# Altium integrated library Samtec 2 mm Pitch Terminal Strips.IntLib: 623 symbols (part 4 of 5)
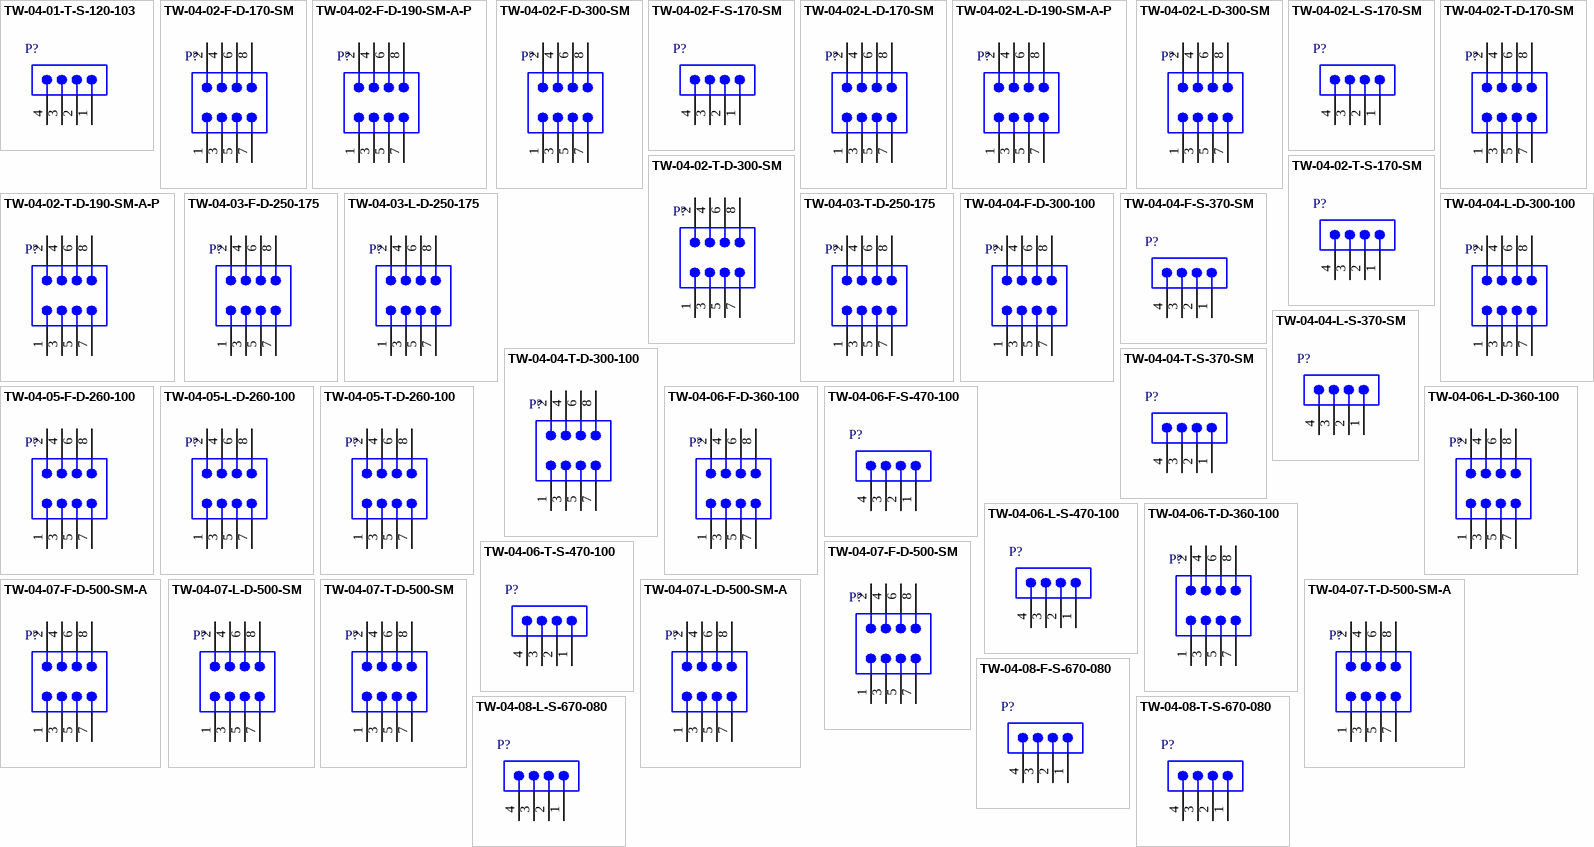
[diagram p20: symbols TW-04-01-T-S-120-103 to TW-04-08-T-S-670-080]

## TW-04-06-T-D-360-100
designator P?
Through-Hole Board Stacker, Vertical, -55 to 105 degC, 2 mm Pitch, 8-Pin, Male, RoHS; Manufacturer: Samtec; PartNumber: TW-04-06-T-D-360-100; Pitch: 2 mm; DatasheetVersion: F-214; PackageVersion: BF, 6/1998; PackageReference: TW-04-06-X-D-360-100; PackageDescription: High Temp 2mm Terminal Strip(Board Stacking); Orientation: Vertical; RoHS: True; Temperature Range: -55 to 105 degC; Mounting Technology: Through-hole; ComponentLink1Description: Manufacturer URL; ComponentLink1URL: http://www.samtec.com; ComponentLink2Description: Datasheet; ComponentLink2URL: http://d2a072wq521u33.cloudfront.net/catalog_english//TW_TH.PDF; ComponentLink3Description: Package Specification; ComponentLink3URL: http://www.samtec.com/documents/webfiles/cpdf/TW-XX-XX-X-X-XXX-XXX-XXX-XX-MKT2.pdf
footprint SMTC-TW-04-06-X-D-360-100 (Terminal Strip, 2x4 Pins, Vertical, 2mm Pitch, Male)
pins: 1, 2, 3, 4, 5, 6, 7, 8

## TW-04-06-T-S-470-100
designator P?
Through-Hole Board Stacker, Vertical, -55 to 105 degC, 2 mm Pitch, 4-Pin, Male, RoHS; Manufacturer: Samtec; PartNumber: TW-04-06-T-S-470-100; Pitch: 2 mm; DatasheetVersion: F-214; PackageVersion: BF, 6/1998; PackageReference: TW-04-06-X-S-470-100; PackageDescription: High Temp 2mm Terminal Strip(Board Stacking); Orientation: Vertical; RoHS: True; Temperature Range: -55 to 105 degC; Mounting Technology: Through-hole; ComponentLink1Description: Manufacturer URL; ComponentLink1URL: http://www.samtec.com; ComponentLink2Description: Datasheet; ComponentLink2URL: http://d2a072wq521u33.cloudfront.net/catalog_english//TW_TH.PDF; ComponentLink3Description: Package Specification; ComponentLink3URL: http://www.samtec.com/documents/webfiles/cpdf/TW-XX-XX-X-X-XXX-XXX-XXX-XX-MKT2.pdf
footprint SMTC-TW-04-06-X-S-470-100 (Terminal Strip, 1x4 Pins, Vertical, 2mm Pitch, Male)
pins: 1, 2, 3, 4

## TW-04-07-F-D-500-SM
designator P?
SMT Board Stacker, Vertical, -55 to 125 degC, 2 mm Pitch, 8-Pin, Male, RoHS; Manufacturer: Samtec; PartNumber: TW-04-07-F-D-500-SM; Pitch: 2 mm; DatasheetVersion: F-214; PackageVersion: CL, 3/1993; PackageReference: TW-04-07-X-D-500-SM; PackageDescription: High Temp 2mm SMT Board Stacking Terminal Strip ASM; Orientation: Vertical; RoHS: True; Temperature Range: -55 to 125 degC; Mounting Technology: Surface Mount; ComponentLink1Description: Manufacturer URL; ComponentLink1URL: http://www.samtec.com; ComponentLink2Description: Datasheet; ComponentLink2URL: http://d2a072wq521u33.cloudfront.net/catalog_english//TW_SM.PDF; ComponentLink3Description: Package Specification; ComponentLink3URL: http://www.samtec.com/documents/webfiles/cpdf/TW-XX-XX-XXX-X-XXX-SM-XXX-XX-MKT1.pdf
footprint SMTC-TW-04-07-X-D-500-SM (SMT Board Stacking Terminal Strip ASM, 2x4 Pins, Vertical, 2mm Pitch, Male)
pins: 1, 2, 3, 4, 5, 6, 7, 8

## TW-04-07-F-D-500-SM-A
designator P?
SMT Board Stacker, Vertical, -55 to 125 degC, 2 mm Pitch, 8-Pin, Male, RoHS; Manufacturer: Samtec; PartNumber: TW-04-07-F-D-500-SM-A; Pitch: 2 mm; DatasheetVersion: F-214; PackageVersion: CL, 3/1993; PackageReference: TW-04-07-X-D-500-SM-A; PackageDescription: High Temp 2mm SMT Board Stacking Terminal Strip ASM; Orientation: Vertical; RoHS: True; Temperature Range: -55 to 125 degC; Mounting Technology: Surface Mount; ComponentLink1Description: Manufacturer URL; ComponentLink1URL: http://www.samtec.com; ComponentLink2Description: Datasheet; ComponentLink2URL: http://d2a072wq521u33.cloudfront.net/catalog_english//TW_SM.PDF; ComponentLink3Description: Package Specification; ComponentLink3URL: http://www.samtec.com/documents/webfiles/cpdf/TW-XX-XX-XXX-X-XXX-SM-XXX-XX-MKT1.pdf
footprint SMTC-TW-04-07-X-D-500-SM-A (SMT Board Stacking Terminal Strip ASM, 2x4 Pins, Vertical, 2mm Pitch, Male)
pins: 1, 2, 3, 4, 5, 6, 7, 8

## TW-04-07-L-D-500-SM
designator P?
SMT Board Stacker, Vertical, -55 to 125 degC, 2 mm Pitch, 8-Pin, Male, RoHS; Manufacturer: Samtec; PartNumber: TW-04-07-L-D-500-SM; Pitch: 2 mm; DatasheetVersion: F-214; PackageVersion: CL, 3/1993; PackageReference: TW-04-07-X-D-500-SM; PackageDescription: High Temp 2mm SMT Board Stacking Terminal Strip ASM; Orientation: Vertical; RoHS: True; Temperature Range: -55 to 125 degC; Mounting Technology: Surface Mount; ComponentLink1Description: Manufacturer URL; ComponentLink1URL: http://www.samtec.com; ComponentLink2Description: Datasheet; ComponentLink2URL: http://d2a072wq521u33.cloudfront.net/catalog_english//TW_SM.PDF; ComponentLink3Description: Package Specification; ComponentLink3URL: http://www.samtec.com/documents/webfiles/cpdf/TW-XX-XX-XXX-X-XXX-SM-XXX-XX-MKT1.pdf
footprint SMTC-TW-04-07-X-D-500-SM (SMT Board Stacking Terminal Strip ASM, 2x4 Pins, Vertical, 2mm Pitch, Male)
pins: 1, 2, 3, 4, 5, 6, 7, 8

## TW-04-07-L-D-500-SM-A
designator P?
SMT Board Stacker, Vertical, -55 to 125 degC, 2 mm Pitch, 8-Pin, Male, RoHS; Manufacturer: Samtec; PartNumber: TW-04-07-L-D-500-SM-A; Pitch: 2 mm; DatasheetVersion: F-214; PackageVersion: CL, 3/1993; PackageReference: TW-04-07-X-D-500-SM-A; PackageDescription: High Temp 2mm SMT Board Stacking Terminal Strip ASM; Orientation: Vertical; RoHS: True; Temperature Range: -55 to 125 degC; Mounting Technology: Surface Mount; ComponentLink1Description: Manufacturer URL; ComponentLink1URL: http://www.samtec.com; ComponentLink2Description: Datasheet; ComponentLink2URL: http://d2a072wq521u33.cloudfront.net/catalog_english//TW_SM.PDF; ComponentLink3Description: Package Specification; ComponentLink3URL: http://www.samtec.com/documents/webfiles/cpdf/TW-XX-XX-XXX-X-XXX-SM-XXX-XX-MKT1.pdf
footprint SMTC-TW-04-07-X-D-500-SM-A (SMT Board Stacking Terminal Strip ASM, 2x4 Pins, Vertical, 2mm Pitch, Male)
pins: 1, 2, 3, 4, 5, 6, 7, 8

## TW-04-07-T-D-500-SM
designator P?
SMT Board Stacker, Vertical, -55 to 105 degC, 2 mm Pitch, 8-Pin, Male, RoHS; Manufacturer: Samtec; PartNumber: TW-04-07-T-D-500-SM; Pitch: 2 mm; DatasheetVersion: F-214; PackageVersion: CL, 3/1993; PackageReference: TW-04-07-X-D-500-SM; PackageDescription: High Temp 2mm SMT Board Stacking Terminal Strip ASM; Orientation: Vertical; RoHS: True; Temperature Range: -55 to 105 degC; Mounting Technology: Surface Mount; ComponentLink1Description: Manufacturer URL; ComponentLink1URL: http://www.samtec.com; ComponentLink2Description: Datasheet; ComponentLink2URL: http://d2a072wq521u33.cloudfront.net/catalog_english//TW_SM.PDF; ComponentLink3Description: Package Specification; ComponentLink3URL: http://www.samtec.com/documents/webfiles/cpdf/TW-XX-XX-XXX-X-XXX-SM-XXX-XX-MKT1.pdf
footprint SMTC-TW-04-07-X-D-500-SM (SMT Board Stacking Terminal Strip ASM, 2x4 Pins, Vertical, 2mm Pitch, Male)
pins: 1, 2, 3, 4, 5, 6, 7, 8

## TW-04-07-T-D-500-SM-A
designator P?
SMT Board Stacker, Vertical, -55 to 105 degC, 2 mm Pitch, 8-Pin, Male, RoHS; Manufacturer: Samtec; PartNumber: TW-04-07-T-D-500-SM-A; Pitch: 2 mm; DatasheetVersion: F-214; PackageVersion: CL, 3/1993; PackageReference: TW-04-07-X-D-500-SM-A; PackageDescription: High Temp 2mm SMT Board Stacking Terminal Strip ASM; Orientation: Vertical; RoHS: True; Temperature Range: -55 to 105 degC; Mounting Technology: Surface Mount; ComponentLink1Description: Manufacturer URL; ComponentLink1URL: http://www.samtec.com; ComponentLink2Description: Datasheet; ComponentLink2URL: http://d2a072wq521u33.cloudfront.net/catalog_english//TW_SM.PDF; ComponentLink3Description: Package Specification; ComponentLink3URL: http://www.samtec.com/documents/webfiles/cpdf/TW-XX-XX-XXX-X-XXX-SM-XXX-XX-MKT1.pdf
footprint SMTC-TW-04-07-X-D-500-SM-A (SMT Board Stacking Terminal Strip ASM, 2x4 Pins, Vertical, 2mm Pitch, Male)
pins: 1, 2, 3, 4, 5, 6, 7, 8

## TW-04-08-F-S-670-080
designator P?
Through-Hole Board Stacker, Vertical, -55 to 125 degC, 2 mm Pitch, 4-Pin, Male, RoHS; Manufacturer: Samtec; PartNumber: TW-04-08-F-S-670-080; Pitch: 2 mm; DatasheetVersion: F-214; PackageVersion: BF, 6/1998; PackageReference: TW-04-08-X-S-670-080; PackageDescription: High Temp 2mm Terminal Strip(Board Stacking); Orientation: Vertical; RoHS: True; Temperature Range: -55 to 125 degC; Mounting Technology: Through-hole; ComponentLink1Description: Manufacturer URL; ComponentLink1URL: http://www.samtec.com; ComponentLink2Description: Datasheet; ComponentLink2URL: http://d2a072wq521u33.cloudfront.net/catalog_english//TW_TH.PDF; ComponentLink3Description: Package Specification; ComponentLink3URL: http://www.samtec.com/documents/webfiles/cpdf/TW-XX-XX-X-X-XXX-XXX-XXX-XX-MKT2.pdf
footprint SMTC-TW-04-08-X-S-670-080 (Terminal Strip, 1x4 Pins, Vertical, 2mm Pitch, Male)
pins: 1, 2, 3, 4

## TW-04-08-L-S-670-080
designator P?
Through-Hole Board Stacker, Vertical, -55 to 125 degC, 2 mm Pitch, 4-Pin, Male, RoHS; Manufacturer: Samtec; PartNumber: TW-04-08-L-S-670-080; Pitch: 2 mm; DatasheetVersion: F-214; PackageVersion: BF, 6/1998; PackageReference: TW-04-08-X-S-670-080; PackageDescription: High Temp 2mm Terminal Strip(Board Stacking); Orientation: Vertical; RoHS: True; Temperature Range: -55 to 125 degC; Mounting Technology: Through-hole; ComponentLink1Description: Manufacturer URL; ComponentLink1URL: http://www.samtec.com; ComponentLink2Description: Datasheet; ComponentLink2URL: http://d2a072wq521u33.cloudfront.net/catalog_english//TW_TH.PDF; ComponentLink3Description: Package Specification; ComponentLink3URL: http://www.samtec.com/documents/webfiles/cpdf/TW-XX-XX-X-X-XXX-XXX-XXX-XX-MKT2.pdf
footprint SMTC-TW-04-08-X-S-670-080 (Terminal Strip, 1x4 Pins, Vertical, 2mm Pitch, Male)
pins: 1, 2, 3, 4

## TW-04-08-T-S-670-080
designator P?
Through-Hole Board Stacker, Vertical, -55 to 105 degC, 2 mm Pitch, 4-Pin, Male, RoHS; Manufacturer: Samtec; PartNumber: TW-04-08-T-S-670-080; Pitch: 2 mm; DatasheetVersion: F-214; PackageVersion: BF, 6/1998; PackageReference: TW-04-08-X-S-670-080; PackageDescription: High Temp 2mm Terminal Strip(Board Stacking); Orientation: Vertical; RoHS: True; Temperature Range: -55 to 105 degC; Mounting Technology: Through-hole; ComponentLink1Description: Manufacturer URL; ComponentLink1URL: http://www.samtec.com; ComponentLink2Description: Datasheet; ComponentLink2URL: http://d2a072wq521u33.cloudfront.net/catalog_english//TW_TH.PDF; ComponentLink3Description: Package Specification; ComponentLink3URL: http://www.samtec.com/documents/webfiles/cpdf/TW-XX-XX-X-X-XXX-XXX-XXX-XX-MKT2.pdf
footprint SMTC-TW-04-08-X-S-670-080 (Terminal Strip, 1x4 Pins, Vertical, 2mm Pitch, Male)
pins: 1, 2, 3, 4

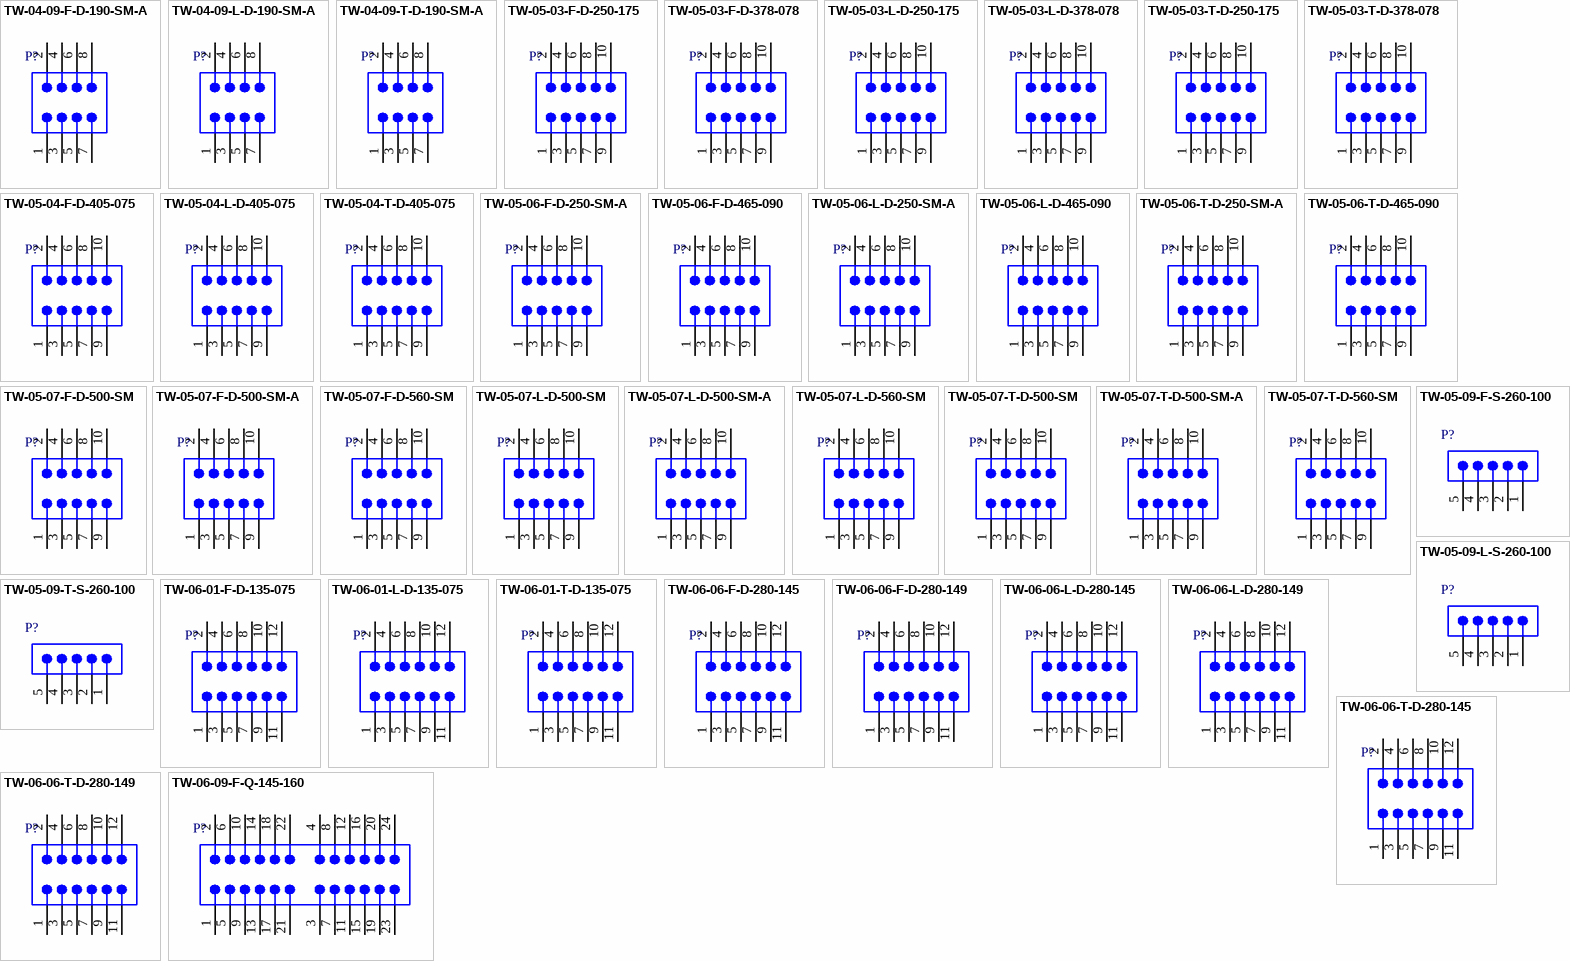
[diagram p11: symbols TW-04-09-F-D-190-SM-A to TW-06-09-F-Q-145-160]

## TW-04-09-F-D-190-SM-A
designator P?
SMT Board Stacker, Vertical, -55 to 125 degC, 2 mm Pitch, 8-Pin, Male, RoHS; Manufacturer: Samtec; PartNumber: TW-04-09-F-D-190-SM-A; Pitch: 2 mm; DatasheetVersion: F-214; PackageVersion: CL, 3/1993; PackageReference: TW-04-09-X-D-190-SM-A; PackageDescription: High Temp 2mm SMT Board Stacking Terminal Strip ASM; Orientation: Vertical; RoHS: True; Temperature Range: -55 to 125 degC; Mounting Technology: Surface Mount; ComponentLink1Description: Manufacturer URL; ComponentLink1URL: http://www.samtec.com; ComponentLink2Description: Datasheet; ComponentLink2URL: http://d2a072wq521u33.cloudfront.net/catalog_english//TW_SM.PDF; ComponentLink3Description: Package Specification; ComponentLink3URL: http://www.samtec.com/documents/webfiles/cpdf/TW-XX-XX-XXX-X-XXX-SM-XXX-XX-MKT1.pdf
footprint SMTC-TW-04-09-X-D-190-SM-A (SMT Board Stacking Terminal Strip ASM, 2x4 Pins, Vertical, 2mm Pitch, Male)
pins: 1, 2, 3, 4, 5, 6, 7, 8

## TW-04-09-L-D-190-SM-A
designator P?
SMT Board Stacker, Vertical, -55 to 125 degC, 2 mm Pitch, 8-Pin, Male, RoHS; Manufacturer: Samtec; PartNumber: TW-04-09-L-D-190-SM-A; Pitch: 2 mm; DatasheetVersion: F-214; PackageVersion: CL, 3/1993; PackageReference: TW-04-09-X-D-190-SM-A; PackageDescription: High Temp 2mm SMT Board Stacking Terminal Strip ASM; Orientation: Vertical; RoHS: True; Temperature Range: -55 to 125 degC; Mounting Technology: Surface Mount; ComponentLink1Description: Manufacturer URL; ComponentLink1URL: http://www.samtec.com; ComponentLink2Description: Datasheet; ComponentLink2URL: http://d2a072wq521u33.cloudfront.net/catalog_english//TW_SM.PDF; ComponentLink3Description: Package Specification; ComponentLink3URL: http://www.samtec.com/documents/webfiles/cpdf/TW-XX-XX-XXX-X-XXX-SM-XXX-XX-MKT1.pdf
footprint SMTC-TW-04-09-X-D-190-SM-A (SMT Board Stacking Terminal Strip ASM, 2x4 Pins, Vertical, 2mm Pitch, Male)
pins: 1, 2, 3, 4, 5, 6, 7, 8

## TW-04-09-T-D-190-SM-A
designator P?
SMT Board Stacker, Vertical, -55 to 105 degC, 2 mm Pitch, 8-Pin, Male, RoHS; Manufacturer: Samtec; PartNumber: TW-04-09-T-D-190-SM-A; Pitch: 2 mm; DatasheetVersion: F-214; PackageVersion: CL, 3/1993; PackageReference: TW-04-09-X-D-190-SM-A; PackageDescription: High Temp 2mm SMT Board Stacking Terminal Strip ASM; Orientation: Vertical; RoHS: True; Temperature Range: -55 to 105 degC; Mounting Technology: Surface Mount; ComponentLink1Description: Manufacturer URL; ComponentLink1URL: http://www.samtec.com; ComponentLink2Description: Datasheet; ComponentLink2URL: http://d2a072wq521u33.cloudfront.net/catalog_english//TW_SM.PDF; ComponentLink3Description: Package Specification; ComponentLink3URL: http://www.samtec.com/documents/webfiles/cpdf/TW-XX-XX-XXX-X-XXX-SM-XXX-XX-MKT1.pdf
footprint SMTC-TW-04-09-X-D-190-SM-A (SMT Board Stacking Terminal Strip ASM, 2x4 Pins, Vertical, 2mm Pitch, Male)
pins: 1, 2, 3, 4, 5, 6, 7, 8

## TW-05-03-F-D-250-175
designator P?
Through-Hole Board Stacker, Vertical, -55 to 125 degC, 2 mm Pitch, 10-Pin, Male, RoHS; Manufacturer: Samtec; PartNumber: TW-05-03-F-D-250-175; Pitch: 2 mm; DatasheetVersion: F-214; PackageVersion: BF, 6/1998; PackageReference: TW-05-03-X-D-250-175; PackageDescription: High Temp 2mm Terminal Strip(Board Stacking); Orientation: Vertical; RoHS: True; Temperature Range: -55 to 125 degC; Mounting Technology: Through-hole; ComponentLink1Description: Manufacturer URL; ComponentLink1URL: http://www.samtec.com; ComponentLink2Description: Datasheet; ComponentLink2URL: http://d2a072wq521u33.cloudfront.net/catalog_english//TW_TH.PDF; ComponentLink3Description: Package Specification; ComponentLink3URL: http://www.samtec.com/documents/webfiles/cpdf/TW-XX-XX-X-X-XXX-XXX-XXX-XX-MKT2.pdf
footprint SMTC-TW-05-03-X-D-250-175 (Terminal Strip, 2x5 Pins, Vertical, 2mm Pitch, Male)
pins: 1, 2, 3, 4, 5, 6, 7, 8, 9, 10

## TW-05-03-F-D-378-078
designator P?
Through-Hole Board Stacker, Vertical, -55 to 125 degC, 2 mm Pitch, 10-Pin, Male, RoHS; Manufacturer: Samtec; PartNumber: TW-05-03-F-D-378-078; Pitch: 2 mm; DatasheetVersion: F-214; PackageVersion: BF, 6/1998; PackageReference: TW-05-03-X-D-378-078; PackageDescription: High Temp 2mm Terminal Strip(Board Stacking); Orientation: Vertical; RoHS: True; Temperature Range: -55 to 125 degC; Mounting Technology: Through-hole; ComponentLink1Description: Manufacturer URL; ComponentLink1URL: http://www.samtec.com; ComponentLink2Description: Datasheet; ComponentLink2URL: http://d2a072wq521u33.cloudfront.net/catalog_english//TW_TH.PDF; ComponentLink3Description: Package Specification; ComponentLink3URL: http://www.samtec.com/documents/webfiles/cpdf/TW-XX-XX-X-X-XXX-XXX-XXX-XX-MKT2.pdf
footprint SMTC-TW-05-03-X-D-378-078 (Terminal Strip, 2x5 Pins, Vertical, 2mm Pitch, Male)
pins: 1, 2, 3, 4, 5, 6, 7, 8, 9, 10

## TW-05-03-L-D-250-175
designator P?
Through-Hole Board Stacker, Vertical, -55 to 125 degC, 2 mm Pitch, 10-Pin, Male, RoHS; Manufacturer: Samtec; PartNumber: TW-05-03-L-D-250-175; Pitch: 2 mm; DatasheetVersion: F-214; PackageVersion: BF, 6/1998; PackageReference: TW-05-03-X-D-250-175; PackageDescription: High Temp 2mm Terminal Strip(Board Stacking); Orientation: Vertical; RoHS: True; Temperature Range: -55 to 125 degC; Mounting Technology: Through-hole; ComponentLink1Description: Manufacturer URL; ComponentLink1URL: http://www.samtec.com; ComponentLink2Description: Datasheet; ComponentLink2URL: http://d2a072wq521u33.cloudfront.net/catalog_english//TW_TH.PDF; ComponentLink3Description: Package Specification; ComponentLink3URL: http://www.samtec.com/documents/webfiles/cpdf/TW-XX-XX-X-X-XXX-XXX-XXX-XX-MKT2.pdf
footprint SMTC-TW-05-03-X-D-250-175 (Terminal Strip, 2x5 Pins, Vertical, 2mm Pitch, Male)
pins: 1, 2, 3, 4, 5, 6, 7, 8, 9, 10

## TW-05-03-L-D-378-078
designator P?
Through-Hole Board Stacker, Vertical, -55 to 125 degC, 2 mm Pitch, 10-Pin, Male, RoHS; Manufacturer: Samtec; PartNumber: TW-05-03-L-D-378-078; Pitch: 2 mm; DatasheetVersion: F-214; PackageVersion: BF, 6/1998; PackageReference: TW-05-03-X-D-378-078; PackageDescription: High Temp 2mm Terminal Strip(Board Stacking); Orientation: Vertical; RoHS: True; Temperature Range: -55 to 125 degC; Mounting Technology: Through-hole; ComponentLink1Description: Manufacturer URL; ComponentLink1URL: http://www.samtec.com; ComponentLink2Description: Datasheet; ComponentLink2URL: http://d2a072wq521u33.cloudfront.net/catalog_english//TW_TH.PDF; ComponentLink3Description: Package Specification; ComponentLink3URL: http://www.samtec.com/documents/webfiles/cpdf/TW-XX-XX-X-X-XXX-XXX-XXX-XX-MKT2.pdf
footprint SMTC-TW-05-03-X-D-378-078 (Terminal Strip, 2x5 Pins, Vertical, 2mm Pitch, Male)
pins: 1, 2, 3, 4, 5, 6, 7, 8, 9, 10

## TW-05-03-T-D-250-175
designator P?
Through-Hole Board Stacker, Vertical, -55 to 105 degC, 2 mm Pitch, 10-Pin, Male, RoHS; Manufacturer: Samtec; PartNumber: TW-05-03-T-D-250-175; Pitch: 2 mm; DatasheetVersion: F-214; PackageVersion: BF, 6/1998; PackageReference: TW-05-03-X-D-250-175; PackageDescription: High Temp 2mm Terminal Strip(Board Stacking); Orientation: Vertical; RoHS: True; Temperature Range: -55 to 105 degC; Mounting Technology: Through-hole; ComponentLink1Description: Manufacturer URL; ComponentLink1URL: http://www.samtec.com; ComponentLink2Description: Datasheet; ComponentLink2URL: http://d2a072wq521u33.cloudfront.net/catalog_english//TW_TH.PDF; ComponentLink3Description: Package Specification; ComponentLink3URL: http://www.samtec.com/documents/webfiles/cpdf/TW-XX-XX-X-X-XXX-XXX-XXX-XX-MKT2.pdf
footprint SMTC-TW-05-03-X-D-250-175 (Terminal Strip, 2x5 Pins, Vertical, 2mm Pitch, Male)
pins: 1, 2, 3, 4, 5, 6, 7, 8, 9, 10

## TW-05-03-T-D-378-078
designator P?
Through-Hole Board Stacker, Vertical, -55 to 105 degC, 2 mm Pitch, 10-Pin, Male, RoHS; Manufacturer: Samtec; PartNumber: TW-05-03-T-D-378-078; Pitch: 2 mm; DatasheetVersion: F-214; PackageVersion: BF, 6/1998; PackageReference: TW-05-03-X-D-378-078; PackageDescription: High Temp 2mm Terminal Strip(Board Stacking); Orientation: Vertical; RoHS: True; Temperature Range: -55 to 105 degC; Mounting Technology: Through-hole; ComponentLink1Description: Manufacturer URL; ComponentLink1URL: http://www.samtec.com; ComponentLink2Description: Datasheet; ComponentLink2URL: http://d2a072wq521u33.cloudfront.net/catalog_english//TW_TH.PDF; ComponentLink3Description: Package Specification; ComponentLink3URL: http://www.samtec.com/documents/webfiles/cpdf/TW-XX-XX-X-X-XXX-XXX-XXX-XX-MKT2.pdf
footprint SMTC-TW-05-03-X-D-378-078 (Terminal Strip, 2x5 Pins, Vertical, 2mm Pitch, Male)
pins: 1, 2, 3, 4, 5, 6, 7, 8, 9, 10

## TW-05-04-F-D-405-075
designator P?
Through-Hole Board Stacker, Vertical, -55 to 125 degC, 2 mm Pitch, 10-Pin, Male, RoHS; Manufacturer: Samtec; PartNumber: TW-05-04-F-D-405-075; Pitch: 2 mm; DatasheetVersion: F-214; PackageVersion: BF, 6/1998; PackageReference: TW-05-04-X-D-405-075; PackageDescription: High Temp 2mm Terminal Strip(Board Stacking); Orientation: Vertical; RoHS: True; Temperature Range: -55 to 125 degC; Mounting Technology: Through-hole; ComponentLink1Description: Manufacturer URL; ComponentLink1URL: http://www.samtec.com; ComponentLink2Description: Datasheet; ComponentLink2URL: http://d2a072wq521u33.cloudfront.net/catalog_english//TW_TH.PDF; ComponentLink3Description: Package Specification; ComponentLink3URL: http://www.samtec.com/documents/webfiles/cpdf/TW-XX-XX-X-X-XXX-XXX-XXX-XX-MKT2.pdf
footprint SMTC-TW-05-04-X-D-405-075 (Terminal Strip, 2x5 Pins, Vertical, 2mm Pitch, Male)
pins: 1, 2, 3, 4, 5, 6, 7, 8, 9, 10

## TW-05-04-L-D-405-075
designator P?
Through-Hole Board Stacker, Vertical, -55 to 125 degC, 2 mm Pitch, 10-Pin, Male, RoHS; Manufacturer: Samtec; PartNumber: TW-05-04-L-D-405-075; Pitch: 2 mm; DatasheetVersion: F-214; PackageVersion: BF, 6/1998; PackageReference: TW-05-04-X-D-405-075; PackageDescription: High Temp 2mm Terminal Strip(Board Stacking); Orientation: Vertical; RoHS: True; Temperature Range: -55 to 125 degC; Mounting Technology: Through-hole; ComponentLink1Description: Manufacturer URL; ComponentLink1URL: http://www.samtec.com; ComponentLink2Description: Datasheet; ComponentLink2URL: http://d2a072wq521u33.cloudfront.net/catalog_english//TW_TH.PDF; ComponentLink3Description: Package Specification; ComponentLink3URL: http://www.samtec.com/documents/webfiles/cpdf/TW-XX-XX-X-X-XXX-XXX-XXX-XX-MKT2.pdf
footprint SMTC-TW-05-04-X-D-405-075 (Terminal Strip, 2x5 Pins, Vertical, 2mm Pitch, Male)
pins: 1, 2, 3, 4, 5, 6, 7, 8, 9, 10

## TW-05-04-T-D-405-075
designator P?
Through-Hole Board Stacker, Vertical, -55 to 105 degC, 2 mm Pitch, 10-Pin, Male, RoHS; Manufacturer: Samtec; PartNumber: TW-05-04-T-D-405-075; Pitch: 2 mm; DatasheetVersion: F-214; PackageVersion: BF, 6/1998; PackageReference: TW-05-04-X-D-405-075; PackageDescription: High Temp 2mm Terminal Strip(Board Stacking); Orientation: Vertical; RoHS: True; Temperature Range: -55 to 105 degC; Mounting Technology: Through-hole; ComponentLink1Description: Manufacturer URL; ComponentLink1URL: http://www.samtec.com; ComponentLink2Description: Datasheet; ComponentLink2URL: http://d2a072wq521u33.cloudfront.net/catalog_english//TW_TH.PDF; ComponentLink3Description: Package Specification; ComponentLink3URL: http://www.samtec.com/documents/webfiles/cpdf/TW-XX-XX-X-X-XXX-XXX-XXX-XX-MKT2.pdf
footprint SMTC-TW-05-04-X-D-405-075 (Terminal Strip, 2x5 Pins, Vertical, 2mm Pitch, Male)
pins: 1, 2, 3, 4, 5, 6, 7, 8, 9, 10

## TW-05-06-F-D-250-SM-A
designator P?
SMT Board Stacker, Vertical, -55 to 125 degC, 2 mm Pitch, 10-Pin, Male, RoHS; Manufacturer: Samtec; PartNumber: TW-05-06-F-D-250-SM-A; Pitch: 2 mm; DatasheetVersion: F-214; PackageVersion: CL, 3/1993; PackageReference: TW-05-06-X-D-250-SM-A; PackageDescription: High Temp 2mm SMT Board Stacking Terminal Strip ASM; Orientation: Vertical; RoHS: True; Temperature Range: -55 to 125 degC; Mounting Technology: Surface Mount; ComponentLink1Description: Manufacturer URL; ComponentLink1URL: http://www.samtec.com; ComponentLink2Description: Datasheet; ComponentLink2URL: http://d2a072wq521u33.cloudfront.net/catalog_english//TW_SM.PDF; ComponentLink3Description: Package Specification; ComponentLink3URL: http://www.samtec.com/documents/webfiles/cpdf/TW-XX-XX-XXX-X-XXX-SM-XXX-XX-MKT1.pdf
footprint SMTC-TW-05-06-X-D-250-SM-A (SMT Board Stacking Terminal Strip ASM, 2x5 Pins, Vertical, 2mm Pitch, Male)
pins: 1, 2, 3, 4, 5, 6, 7, 8, 9, 10

## TW-05-06-F-D-465-090
designator P?
Through-Hole Board Stacker, Vertical, -55 to 125 degC, 2 mm Pitch, 10-Pin, Male, RoHS; Manufacturer: Samtec; PartNumber: TW-05-06-F-D-465-090; Pitch: 2 mm; DatasheetVersion: F-214; PackageVersion: BF, 6/1998; PackageReference: TW-05-06-X-D-465-090; PackageDescription: High Temp 2mm Terminal Strip(Board Stacking); Orientation: Vertical; RoHS: True; Temperature Range: -55 to 125 degC; Mounting Technology: Through-hole; ComponentLink1Description: Manufacturer URL; ComponentLink1URL: http://www.samtec.com; ComponentLink2Description: Datasheet; ComponentLink2URL: http://d2a072wq521u33.cloudfront.net/catalog_english//TW_TH.PDF; ComponentLink3Description: Package Specification; ComponentLink3URL: http://www.samtec.com/documents/webfiles/cpdf/TW-XX-XX-X-X-XXX-XXX-XXX-XX-MKT2.pdf
footprint SMTC-TW-05-06-X-D-465-090 (Terminal Strip, 2x5 Pins, Vertical, 2mm Pitch, Male)
pins: 1, 2, 3, 4, 5, 6, 7, 8, 9, 10

## TW-05-06-L-D-250-SM-A
designator P?
SMT Board Stacker, Vertical, -55 to 125 degC, 2 mm Pitch, 10-Pin, Male, RoHS; Manufacturer: Samtec; PartNumber: TW-05-06-L-D-250-SM-A; Pitch: 2 mm; DatasheetVersion: F-214; PackageVersion: CL, 3/1993; PackageReference: TW-05-06-X-D-250-SM-A; PackageDescription: High Temp 2mm SMT Board Stacking Terminal Strip ASM; Orientation: Vertical; RoHS: True; Temperature Range: -55 to 125 degC; Mounting Technology: Surface Mount; ComponentLink1Description: Manufacturer URL; ComponentLink1URL: http://www.samtec.com; ComponentLink2Description: Datasheet; ComponentLink2URL: http://d2a072wq521u33.cloudfront.net/catalog_english//TW_SM.PDF; ComponentLink3Description: Package Specification; ComponentLink3URL: http://www.samtec.com/documents/webfiles/cpdf/TW-XX-XX-XXX-X-XXX-SM-XXX-XX-MKT1.pdf
footprint SMTC-TW-05-06-X-D-250-SM-A (SMT Board Stacking Terminal Strip ASM, 2x5 Pins, Vertical, 2mm Pitch, Male)
pins: 1, 2, 3, 4, 5, 6, 7, 8, 9, 10

## TW-05-06-L-D-465-090
designator P?
Through-Hole Board Stacker, Vertical, -55 to 125 degC, 2 mm Pitch, 10-Pin, Male, RoHS; Manufacturer: Samtec; PartNumber: TW-05-06-L-D-465-090; Pitch: 2 mm; DatasheetVersion: F-214; PackageVersion: BF, 6/1998; PackageReference: TW-05-06-X-D-465-090; PackageDescription: High Temp 2mm Terminal Strip(Board Stacking); Orientation: Vertical; RoHS: True; Temperature Range: -55 to 125 degC; Mounting Technology: Through-hole; ComponentLink1Description: Manufacturer URL; ComponentLink1URL: http://www.samtec.com; ComponentLink2Description: Datasheet; ComponentLink2URL: http://d2a072wq521u33.cloudfront.net/catalog_english//TW_TH.PDF; ComponentLink3Description: Package Specification; ComponentLink3URL: http://www.samtec.com/documents/webfiles/cpdf/TW-XX-XX-X-X-XXX-XXX-XXX-XX-MKT2.pdf
footprint SMTC-TW-05-06-X-D-465-090 (Terminal Strip, 2x5 Pins, Vertical, 2mm Pitch, Male)
pins: 1, 2, 3, 4, 5, 6, 7, 8, 9, 10

## TW-05-06-T-D-250-SM-A
designator P?
SMT Board Stacker, Vertical, -55 to 105 degC, 2 mm Pitch, 10-Pin, Male, RoHS; Manufacturer: Samtec; PartNumber: TW-05-06-T-D-250-SM-A; Pitch: 2 mm; DatasheetVersion: F-214; PackageVersion: CL, 3/1993; PackageReference: TW-05-06-X-D-250-SM-A; PackageDescription: High Temp 2mm SMT Board Stacking Terminal Strip ASM; Orientation: Vertical; RoHS: True; Temperature Range: -55 to 105 degC; Mounting Technology: Surface Mount; ComponentLink1Description: Manufacturer URL; ComponentLink1URL: http://www.samtec.com; ComponentLink2Description: Datasheet; ComponentLink2URL: http://d2a072wq521u33.cloudfront.net/catalog_english//TW_SM.PDF; ComponentLink3Description: Package Specification; ComponentLink3URL: http://www.samtec.com/documents/webfiles/cpdf/TW-XX-XX-XXX-X-XXX-SM-XXX-XX-MKT1.pdf
footprint SMTC-TW-05-06-X-D-250-SM-A (SMT Board Stacking Terminal Strip ASM, 2x5 Pins, Vertical, 2mm Pitch, Male)
pins: 1, 2, 3, 4, 5, 6, 7, 8, 9, 10

## TW-05-06-T-D-465-090
designator P?
Through-Hole Board Stacker, Vertical, -55 to 105 degC, 2 mm Pitch, 10-Pin, Male, RoHS; Manufacturer: Samtec; PartNumber: TW-05-06-T-D-465-090; Pitch: 2 mm; DatasheetVersion: F-214; PackageVersion: BF, 6/1998; PackageReference: TW-05-06-X-D-465-090; PackageDescription: High Temp 2mm Terminal Strip(Board Stacking); Orientation: Vertical; RoHS: True; Temperature Range: -55 to 105 degC; Mounting Technology: Through-hole; ComponentLink1Description: Manufacturer URL; ComponentLink1URL: http://www.samtec.com; ComponentLink2Description: Datasheet; ComponentLink2URL: http://d2a072wq521u33.cloudfront.net/catalog_english//TW_TH.PDF; ComponentLink3Description: Package Specification; ComponentLink3URL: http://www.samtec.com/documents/webfiles/cpdf/TW-XX-XX-X-X-XXX-XXX-XXX-XX-MKT2.pdf
footprint SMTC-TW-05-06-X-D-465-090 (Terminal Strip, 2x5 Pins, Vertical, 2mm Pitch, Male)
pins: 1, 2, 3, 4, 5, 6, 7, 8, 9, 10

## TW-05-07-F-D-500-SM
designator P?
SMT Board Stacker, Vertical, -55 to 125 degC, 2 mm Pitch, 10-Pin, Male, RoHS; Manufacturer: Samtec; PartNumber: TW-05-07-F-D-500-SM; Pitch: 2 mm; DatasheetVersion: F-214; PackageVersion: CL, 3/1993; PackageReference: TW-05-07-X-D-500-SM; PackageDescription: High Temp 2mm SMT Board Stacking Terminal Strip ASM; Orientation: Vertical; RoHS: True; Temperature Range: -55 to 125 degC; Mounting Technology: Surface Mount; ComponentLink1Description: Manufacturer URL; ComponentLink1URL: http://www.samtec.com; ComponentLink2Description: Datasheet; ComponentLink2URL: http://d2a072wq521u33.cloudfront.net/catalog_english//TW_SM.PDF; ComponentLink3Description: Package Specification; ComponentLink3URL: http://www.samtec.com/documents/webfiles/cpdf/TW-XX-XX-XXX-X-XXX-SM-XXX-XX-MKT1.pdf
footprint SMTC-TW-05-07-X-D-500-SM (SMT Board Stacking Terminal Strip ASM, 2x5 Pins, Vertical, 2mm Pitch, Male)
pins: 1, 2, 3, 4, 5, 6, 7, 8, 9, 10

## TW-05-07-F-D-500-SM-A
designator P?
SMT Board Stacker, Vertical, -55 to 125 degC, 2 mm Pitch, 10-Pin, Male, RoHS; Manufacturer: Samtec; PartNumber: TW-05-07-F-D-500-SM-A; Pitch: 2 mm; DatasheetVersion: F-214; PackageVersion: CL, 3/1993; PackageReference: TW-05-07-X-D-500-SM-A; PackageDescription: High Temp 2mm SMT Board Stacking Terminal Strip ASM; Orientation: Vertical; RoHS: True; Temperature Range: -55 to 125 degC; Mounting Technology: Surface Mount; ComponentLink1Description: Manufacturer URL; ComponentLink1URL: http://www.samtec.com; ComponentLink2Description: Datasheet; ComponentLink2URL: http://d2a072wq521u33.cloudfront.net/catalog_english//TW_SM.PDF; ComponentLink3Description: Package Specification; ComponentLink3URL: http://www.samtec.com/documents/webfiles/cpdf/TW-XX-XX-XXX-X-XXX-SM-XXX-XX-MKT1.pdf
footprint SMTC-TW-05-07-X-D-500-SM-A (SMT Board Stacking Terminal Strip ASM, 2x5 Pins, Vertical, 2mm Pitch, Male)
pins: 1, 2, 3, 4, 5, 6, 7, 8, 9, 10

## TW-05-07-F-D-560-SM
designator P?
SMT Board Stacker, Vertical, -55 to 125 degC, 2 mm Pitch, 10-Pin, Male, RoHS; Manufacturer: Samtec; PartNumber: TW-05-07-F-D-560-SM; Pitch: 2 mm; DatasheetVersion: F-214; PackageVersion: CL, 3/1993; PackageReference: TW-05-07-X-D-560-SM; PackageDescription: High Temp 2mm SMT Board Stacking Terminal Strip ASM; Orientation: Vertical; RoHS: True; Temperature Range: -55 to 125 degC; Mounting Technology: Surface Mount; ComponentLink1Description: Manufacturer URL; ComponentLink1URL: http://www.samtec.com; ComponentLink2Description: Datasheet; ComponentLink2URL: http://d2a072wq521u33.cloudfront.net/catalog_english//TW_SM.PDF; ComponentLink3Description: Package Specification; ComponentLink3URL: http://www.samtec.com/documents/webfiles/cpdf/TW-XX-XX-XXX-X-XXX-SM-XXX-XX-MKT1.pdf
footprint SMTC-TW-05-07-X-D-560-SM (SMT Board Stacking Terminal Strip ASM, 2x5 Pins, Vertical, 2mm Pitch, Male)
pins: 1, 2, 3, 4, 5, 6, 7, 8, 9, 10

## TW-05-07-L-D-500-SM
designator P?
SMT Board Stacker, Vertical, -55 to 125 degC, 2 mm Pitch, 10-Pin, Male, RoHS; Manufacturer: Samtec; PartNumber: TW-05-07-L-D-500-SM; Pitch: 2 mm; DatasheetVersion: F-214; PackageVersion: CL, 3/1993; PackageReference: TW-05-07-X-D-500-SM; PackageDescription: High Temp 2mm SMT Board Stacking Terminal Strip ASM; Orientation: Vertical; RoHS: True; Temperature Range: -55 to 125 degC; Mounting Technology: Surface Mount; ComponentLink1Description: Manufacturer URL; ComponentLink1URL: http://www.samtec.com; ComponentLink2Description: Datasheet; ComponentLink2URL: http://d2a072wq521u33.cloudfront.net/catalog_english//TW_SM.PDF; ComponentLink3Description: Package Specification; ComponentLink3URL: http://www.samtec.com/documents/webfiles/cpdf/TW-XX-XX-XXX-X-XXX-SM-XXX-XX-MKT1.pdf
footprint SMTC-TW-05-07-X-D-500-SM (SMT Board Stacking Terminal Strip ASM, 2x5 Pins, Vertical, 2mm Pitch, Male)
pins: 1, 2, 3, 4, 5, 6, 7, 8, 9, 10

## TW-05-07-L-D-500-SM-A
designator P?
SMT Board Stacker, Vertical, -55 to 125 degC, 2 mm Pitch, 10-Pin, Male, RoHS; Manufacturer: Samtec; PartNumber: TW-05-07-L-D-500-SM-A; Pitch: 2 mm; DatasheetVersion: F-214; PackageVersion: CL, 3/1993; PackageReference: TW-05-07-X-D-500-SM-A; PackageDescription: High Temp 2mm SMT Board Stacking Terminal Strip ASM; Orientation: Vertical; RoHS: True; Temperature Range: -55 to 125 degC; Mounting Technology: Surface Mount; ComponentLink1Description: Manufacturer URL; ComponentLink1URL: http://www.samtec.com; ComponentLink2Description: Datasheet; ComponentLink2URL: http://d2a072wq521u33.cloudfront.net/catalog_english//TW_SM.PDF; ComponentLink3Description: Package Specification; ComponentLink3URL: http://www.samtec.com/documents/webfiles/cpdf/TW-XX-XX-XXX-X-XXX-SM-XXX-XX-MKT1.pdf
footprint SMTC-TW-05-07-X-D-500-SM-A (SMT Board Stacking Terminal Strip ASM, 2x5 Pins, Vertical, 2mm Pitch, Male)
pins: 1, 2, 3, 4, 5, 6, 7, 8, 9, 10

## TW-05-07-L-D-560-SM
designator P?
SMT Board Stacker, Vertical, -55 to 125 degC, 2 mm Pitch, 10-Pin, Male, RoHS; Manufacturer: Samtec; PartNumber: TW-05-07-L-D-560-SM; Pitch: 2 mm; DatasheetVersion: F-214; PackageVersion: CL, 3/1993; PackageReference: TW-05-07-X-D-560-SM; PackageDescription: High Temp 2mm SMT Board Stacking Terminal Strip ASM; Orientation: Vertical; RoHS: True; Temperature Range: -55 to 125 degC; Mounting Technology: Surface Mount; ComponentLink1Description: Manufacturer URL; ComponentLink1URL: http://www.samtec.com; ComponentLink2Description: Datasheet; ComponentLink2URL: http://d2a072wq521u33.cloudfront.net/catalog_english//TW_SM.PDF; ComponentLink3Description: Package Specification; ComponentLink3URL: http://www.samtec.com/documents/webfiles/cpdf/TW-XX-XX-XXX-X-XXX-SM-XXX-XX-MKT1.pdf
footprint SMTC-TW-05-07-X-D-560-SM (SMT Board Stacking Terminal Strip ASM, 2x5 Pins, Vertical, 2mm Pitch, Male)
pins: 1, 2, 3, 4, 5, 6, 7, 8, 9, 10

## TW-05-07-T-D-500-SM
designator P?